# Altium footprint library SBCLib.PcbLib: 120 footprints (part 6 of 8)
Each footprint in its own frame and in the unit in brackets; x right, y up, seen from the top. Pads: shape width x height; smd on the part's side, far side on the other; paste and mask are expansions set on the pad; w line width, h text height; cw(c..) or ccw(c..) is an arc to the next point about the centre after c.
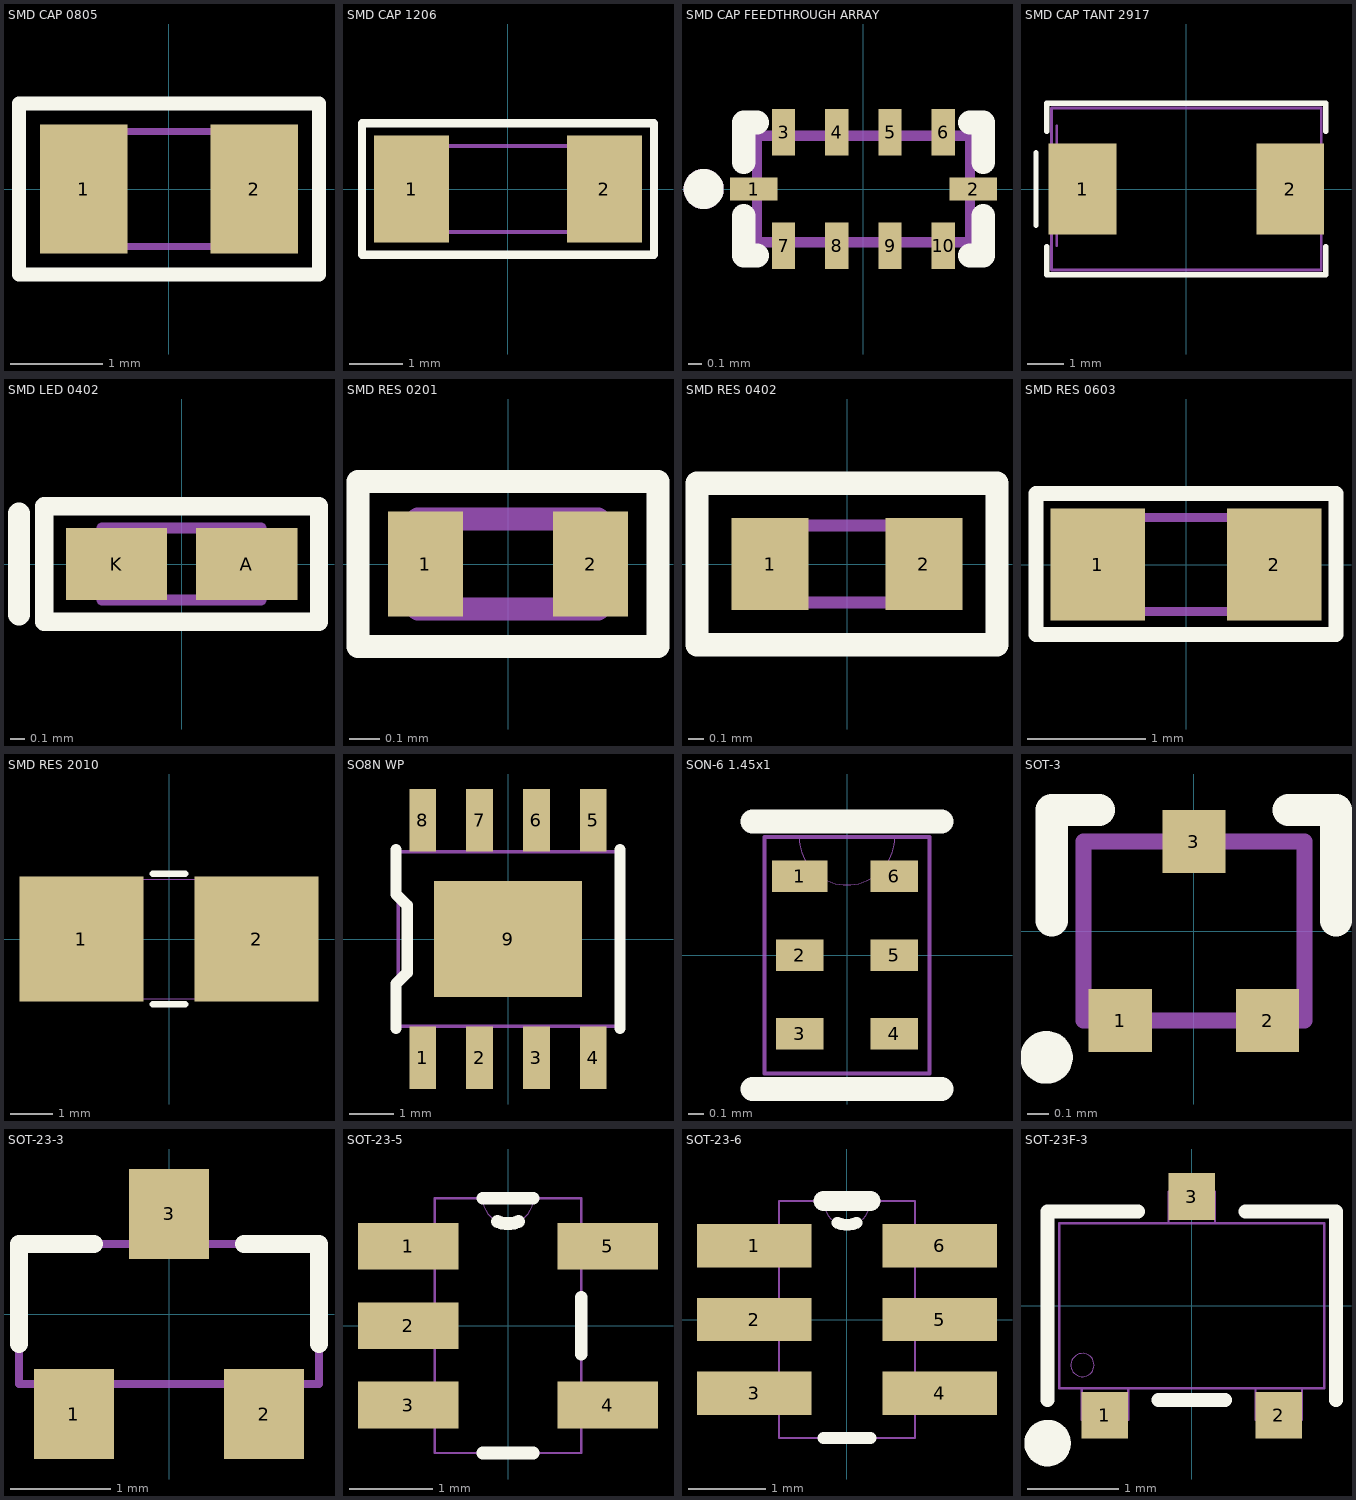
[diagram p5: the footprints below, top view; thin cyan lines are the x and y axes]

## SMD CAP 0805 [mm]
pads (2):
  rect 0.95x1.4 smd mask+0.05: 1(-0.925,0) 2(0.925,0)
Top Overlay:
  lines w0.152: -1.628,-0.928 -1.628,0.928 1.628,0.928 1.628,-0.928 -1.628,-0.928
Mechanical 3:
  lines w0.076: -1,-0.625 1,-0.625 1,0.625 -1,0.625 -1,-0.625
3D body "C0805_085.step": height 0.85, standoff 0, extent -1,-0.625 1,0.625

## SMD CAP 1206 [mm]
pads (2):
  rect 1.4x2 smd: 1(-1.8,0) 2(1.8,0)
Top Overlay:
  lines w0.152: -2.728,-1.228 -0.528,-1.228 2.728,-1.228 2.728,0.628 2.728,1.228 0.528,1.228 -2.728,1.228 -2.728,-0.628 -2.728,-1.228
Mechanical 3:
  lines w0.076: -1.6,-0.8 -1.6,0.8 1.6,0.8 1.6,-0.8 -1.6,-0.8
3D body "C1206_180.step": height 1.8, standoff 0, extent -1.6,-0.8 1.6,0.8

## SMD CAP FEEDTHROUGH ARRAY [mm]
pads (10):
  rect 0.356x0.175 smd paste-1 mask+0: 1(-0.825,0) 2(0.825,0)
  rect 0.175x0.35 smd mask+0: 3(-0.6,0.425) 4(-0.2,0.425) 5(0.2,0.425) 6(0.6,0.425) 7(-0.6,-0.425) 8(-0.2,-0.425) 9(0.2,-0.425) 10(0.6,-0.425)
Top Overlay:
  circle w0.2: c-1.2,0 r0.05
  lines w0.178: -0.9,-0.2 -0.9,-0.5 -0.8,-0.5 ; -0.9,0.2 -0.9,0.5 -0.8,0.5 ; 0.8,-0.5 0.9,-0.5 0.9,-0.2 ; 0.8,0.5 0.9,0.5 0.9,0.2
Top Paste:
  region: 1,-0.088 0.7,-0.088 0.65,-0.038 0.65,0.038 0.7,0.088 1,0.088
  region: -0.65,0.038 -0.65,-0.038 -0.7,-0.088 -1,-0.088 -1,0.088 -0.7,0.088
Top Solder:
  region: 0.687,-0.6 0.513,-0.6 0.513,-0.25 0.687,-0.25
  region: 0.288,-0.6 0.112,-0.6 0.112,-0.25 0.288,-0.25
  region: -0.112,-0.6 -0.288,-0.6 -0.288,-0.25 -0.112,-0.25
  region: -0.513,-0.6 -0.687,-0.6 -0.687,-0.25 -0.513,-0.25
  region: 0.687,0.25 0.513,0.25 0.513,0.6 0.687,0.6
  region: 0.288,0.25 0.112,0.25 0.112,0.6 0.288,0.6
  region: -0.112,0.25 -0.288,0.25 -0.288,0.6 -0.112,0.6
  region: -0.513,0.25 -0.687,0.25 -0.687,0.6 -0.513,0.6
  region: 1,-0.088 0.7,-0.088 0.65,-0.038 0.65,0.038 0.7,0.088 1,0.088
  region: -0.65,0.038 -0.65,-0.038 -0.7,-0.088 -1,-0.088 -1,0.088 -0.7,0.088
Mechanical 3:
  circle w0.2: c-1.2,0 r0.05
  lines w0.076: -0.8,-0.4 -0.8,0.4 0.8,0.4 0.8,-0.4 -0.8,-0.4
3D body "NFA18SL307V1A45L.STEP": height 0.65, standoff 0, extent -0.8,-0.4 0.8,0.4

## SMD CAP TANT 2917 [mil]
pads (2):
  rect 74x100 smd: 1(-113.5,0) 2(113.5,0)
Top Overlay:
  lines w6: -164.37,-39.37 -164.37,39.37 ; -152.5,-62.95 -152.5,-93.5 152.5,-93.5 152.5,-62.95 ; -152.5,62.95 -152.5,93.5 152.5,93.5 152.5,62.95
Mechanical 3:
  lines w3: -141.73,-62.01 -141.73,68.9 ; -147.48,-88.5 -147.48,88.51 147.48,88.51 147.48,-88.5 -147.48,-88.5
Mechanical 13:
  lines w1: -147.5,-88.5 147.5,-88.5 147.5,88.5 -147.5,88.5 -147.5,-88.5
3D body "TAJD_AVX.step": height 124.02, standoff 0, extent -147.48,-88.5 147.48,88.51

## SMD LED 0402 [mm]
pads (2):
  rect 0.7x0.5 smd mask+0.05: A(0.45,0) K(-0.45,0)
Top Overlay:
  lines w0.127: -0.95,-0.4 0.95,-0.4 0.95,0.4 -0.95,0.4 -0.95,-0.4
  lines w0.152: -1.125,-0.35 -1.125,0.35
Mechanical 3:
  lines w0.076: -0.55,-0.25 -0.55,0.25 0.55,0.25 0.55,-0.25 -0.55,-0.25
3D body "APHHS1005.sldprt": height 0.5, standoff 0, extent -0.5,-0.25 0.5,0.25

## SMD RES 0201 [mm]
pads (2):
  rect 0.25x0.35 smd mask+0.05: 1(-0.275,0) 2(0.275,0)
Top Overlay:
  lines w0.076: -0.5,-0.275 -0.5,0.275 0.5,0.275 0.5,-0.275 -0.5,-0.275
Mechanical 3:
  lines w0.076: -0.3,-0.15 0.3,-0.15 0.3,0.15 -0.3,0.15 -0.3,-0.15
3D body "R0201_detailed.step": height 0.23, standoff 0, extent -0.3,-0.15 0.3,0.15

## SMD RES 0402 [mm]
pads (2):
  rect 0.5x0.6 smd mask+0.05: 1(-0.5,0) 2(0.5,0)
Top Overlay:
  lines w0.152: -0.976,-0.526 0.976,-0.526 0.976,0.526 -0.976,0.526 -0.976,-0.526
Mechanical 3:
  lines w0.076: -0.55,-0.25 -0.55,0.25 0.55,0.25 0.55,-0.25 -0.55,-0.25
3D body "R0402_detailed.step": height 0.32, standoff 0, extent -0.55,-0.25 0.55,0.25

## SMD RES 0603 [mm]
pads (2):
  rect 0.8x0.95 smd mask+0.05: 1(-0.75,0) 2(0.75,0)
Top Overlay:
  lines w0.127: -1.275,-0.596 1.275,-0.596 1.275,-0.075 1.275,0.605 -1.275,0.605 -1.275,-0.596
Mechanical 3:
  lines w0.076: -0.8,-0.4 -0.8,0.4 0.8,0.4 0.8,-0.4 -0.8,-0.4
3D body "R0603_detailed.step": height 0.45, standoff 0, extent -0.8,-0.4 0.8,0.4

## SMD RES 2010 [mm]
pads (2):
  rect 2.89x2.92 smd paste+0 mask+0: 1(-2.045,0) 2(2.045,0)
Top Overlay:
  lines w0.152: -0.381,-1.524 0.381,-1.524 ; -0.381,1.524 0.381,1.524
Mechanical 3:
  lines w0.025: -2.667,-1.397 -2.667,1.397 ; -2.667,-1.397 -2.667,1.397 ; -2.667,-1.397 -1.118,-1.397 -1.118,1.397 -2.667,1.397 ; -2.667,-1.397 2.667,-1.397 ; -2.667,1.397 2.667,1.397 ; 2.667,-1.397 2.667,1.397 ; 2.667,-1.397 2.667,1.397 ; 2.667,-1.397 1.118,-1.397 1.118,1.397 2.667,1.397
3D body "STA_CSNL2010_3__STP.step": height 1.04, standoff 0, extent -2.667,-1.397 2.667,1.397

## SO8N WP [mm] "INDUSTRY STANDARD SO-8N W PAD"
height 1.75
pads (9):
  rect 0.6x1.4 smd: 1(-1.905,-2.65) 2(-0.635,-2.65) 3(0.635,-2.65) 4(1.905,-2.65) 5(1.905,2.65) 6(0.635,2.65) 7(-0.635,2.65) 8(-1.905,2.65)
  rect 3.3x2.6 smd: 9(0,0)
Top Overlay:
  lines w0.254: -2.5,-2 -2.5,-1 -2.25,-0.75 -2.25,0.75 -2.5,1 -2.5,2 ; 2.5,-2 2.5,2
Mechanical 3:
  lines w0.076: -2.45,-1.95 2.45,-1.95 2.45,1.95 -2.45,1.95 -2.45,-1.95
3D body "SOIC08 narrow.stp": height 2, standoff 0, extent -2.5,-3.082 2.5,3.081

## SON-6 1.45x1 [mm]
pads (6):
  rect 0.35x0.2 smd paste+0: 1(-0.3,0.5)
  rect 0.3x0.2 smd paste+0: 2(-0.3,0) 3(-0.3,-0.5) 4(0.3,-0.5) 5(0.3,0) 6(0.3,0.5)
Top Overlay:
  lines w0.152: -0.6,-0.85 0.6,-0.85 ; -0.6,0.85 0.6,0.85
Top Paste:
  region: 0.605,0.625 0.135,0.625 0.135,0.375 0.605,0.375
  region: 0.605,0.125 0.135,0.125 0.135,-0.125 0.605,-0.125
  region: 0.605,-0.375 0.135,-0.375 0.135,-0.625 0.605,-0.625
  region: -0.135,-0.375 -0.605,-0.375 -0.605,-0.625 -0.135,-0.625
  region: -0.135,0.125 -0.605,0.125 -0.605,-0.125 -0.135,-0.125
  region: -0.105,0.625 -0.605,0.625 -0.605,0.375 -0.105,0.375
Top Solder:
  region: 0.7,0.72 0.04,0.72 0.04,0.28 0.7,0.28
  region: 0.7,0.22 0.04,0.22 0.04,-0.22 0.7,-0.22
  region: 0.7,-0.28 0.04,-0.28 0.04,-0.72 0.7,-0.72
  region: -0.04,-0.28 -0.7,-0.28 -0.7,-0.72 -0.04,-0.72
  region: -0.04,0.22 -0.7,0.22 -0.7,-0.22 -0.04,-0.22
  region: -0.04,0.72 -0.7,0.72 -0.7,0.28 -0.04,0.28
Mechanical 3:
  lines w0: -0.305,0.75 ccw(c0,0.75) 0.305,0.75
  lines w0.025: -0.525,-0.75 -0.525,0.75 0.525,0.75 0.525,-0.75 -0.525,-0.75
3D body "DRY0006A.stp": height 0.58, standoff 0, extent -0.5,-0.725 0.5,0.725

## SOT-3 [mm]
pads (3):
  rect 0.3x0.3 smd paste+0 mask+0.051: 1(-0.35,-0.425) 2(0.35,-0.425) 3(0,0.425)
Top Overlay:
  circle w0.15: c-0.7,-0.6 r0.05
  lines w0.152: -0.675,0.05 -0.675,0.575 -0.45,0.575 ; 0.45,0.575 0.675,0.575 0.675,0.05
Mechanical 3:
  lines w0.076: -0.525,-0.425 -0.525,0.425 0.525,0.425 0.525,-0.425 -0.525,-0.425
3D body "DRT0003A.stp": height 0.5, standoff 0, extent -0.5,-0.5 0.5,0.5

## SOT-23-3 [mm]
pads (3):
  rect 0.8x0.9 smd: 1(-0.95,-1) 2(0.95,-1) 3(0,1)
Top Overlay:
  lines w0.178: -1.5,-0.3 -1.5,0.7 -0.75,0.7 ; 0.75,0.7 1.5,0.7 1.5,-0.3
Mechanical 3:
  lines w0.076: -1.5,-0.7 1.5,-0.7 1.5,0.7 -1.5,0.7 -1.5,-0.7
3D body "SOT23.stp": height 1.12, standoff -0.02, extent -2.217,-2.25 2.038,1.968

## SOT-23-5 [mil]
pads (5):
  rect 47.24x22 smd: 1(-47,37.4) 2(-47,0) 3(-47,-37.4) 4(47,-37.4) 5(47,37.4)
Top Overlay:
  lines w6: -11.91,-60 11.91,-60 ; -11.91,60 11.91,60 ; -4.92,49.05 ccw(c0,60) 4.92,49.05 ; 34.5,-13.3 34.5,13.3
Mechanical 3:
  lines w0: -12,60 ccw(c0,60) 12,60
  lines w1: -59,-47.4 -34.5,-47.4 -34.5,-27.4 -59,-27.4 -59,-47.4 ; -59,-10 -59,10 -34.5,10 -34.5,-10 -59,-10 ; -59,27.4 -34.5,27.4 -34.5,47.4 -59,47.4 -59,27.4 ; -34.5,-60 34.5,-60 34.5,60 -34.5,60 -34.5,-60 ; 34.5,-47.4 59,-47.4 59,-27.4 34.5,-27.4 34.5,-47.4 ; 34.5,27.4 59,27.4 59,47.4 34.5,47.4 34.5,27.4
3D body "DBV0005A.stp": height 47.24, standoff 0, extent -55.11,-57.08 55.12,57.09

## SOT-23-6 [mil]
pads (6):
  rect 58x22 smd: 1(-47,37.4) 2(-47,0) 3(-47,-37.4) 4(47,-37.4) 5(47,0) 6(47,37.4)
Top Overlay:
  lines w6: -11.91,-60 11.91,-60 ; -4.91,49.06 ccw(c0,60) 4.92,49.06
  lines w10: -11.91,60 11.91,60
Mechanical 3:
  lines w0: -12,60 ccw(c0,60) 12,60
  lines w1: -59,-47.4 -59,-27.4 -34.5,-27.4 -34.5,-47.4 -59,-47.4 ; -59,-10 -34.5,-10 -34.5,10 -59,10 -59,-10 ; -59,27.4 -59,47.4 -34.5,47.4 -34.5,27.4 -59,27.4 ; -34.5,-60 -34.5,60 34.5,60 34.5,-60 -34.5,-60 ; 34.5,-47.4 34.5,-27.4 59,-27.4 59,-47.4 34.5,-47.4 ; 34.5,-10 59,-10 59,10 34.5,10 34.5,-10 ; 34.5,27.4 34.5,47.4 59,47.4 59,27.4 34.5,27.4
3D body "SOT-23-6_DBV_TEX.step": height 57.09, standoff 0, extent -59.01,-60 59.02,60

## SOT-23F-3 [mil]
pads (3):
  rect 20x20 smd paste+0 mask+0: 1(-37.4,-47) 2(37.4,-47) 3(0,47)
Top Overlay:
  circle w10: c-62.01,-59.06 r5
  lines w6: -62,-40.5 -62,40.5 -23.1,40.5 ; -14.3,-40.5 14.3,-40.5 ; 23.1,40.5 62,40.5 62,-40.5
Mechanical 3:
  circle w0: c-47,-25.5 r5
  lines w1: -57,-35.5 -57,35.5 57,35.5 57,-35.5 -57,-35.5 ; -47.4,-49 -47.4,-35.5 -27.4,-35.5 -27.4,-49 -47.4,-49 ; -10,35.5 -10,49 10,49 10,35.5 -10,35.5 ; 27.4,-49 27.4,-35.5 47.4,-35.5 47.4,-49 27.4,-49
3D body "SOT-23F.STEP": height 31.5, standoff 0, extent -57.08,-47.24 57.09,47.25